# Altium footprint library SG__PCB_HOLE_Connector.PcbLib: 174 footprints (part 9 of 11)
Each footprint in its own frame and in the unit in brackets; x right, y up, seen from the top. Pads: shape width x height; smd on the part's side, far side on the other; paste and mask are expansions set on the pad; w line width, h text height; cw(c..) or ccw(c..) is an arc to the next point about the centre after c.
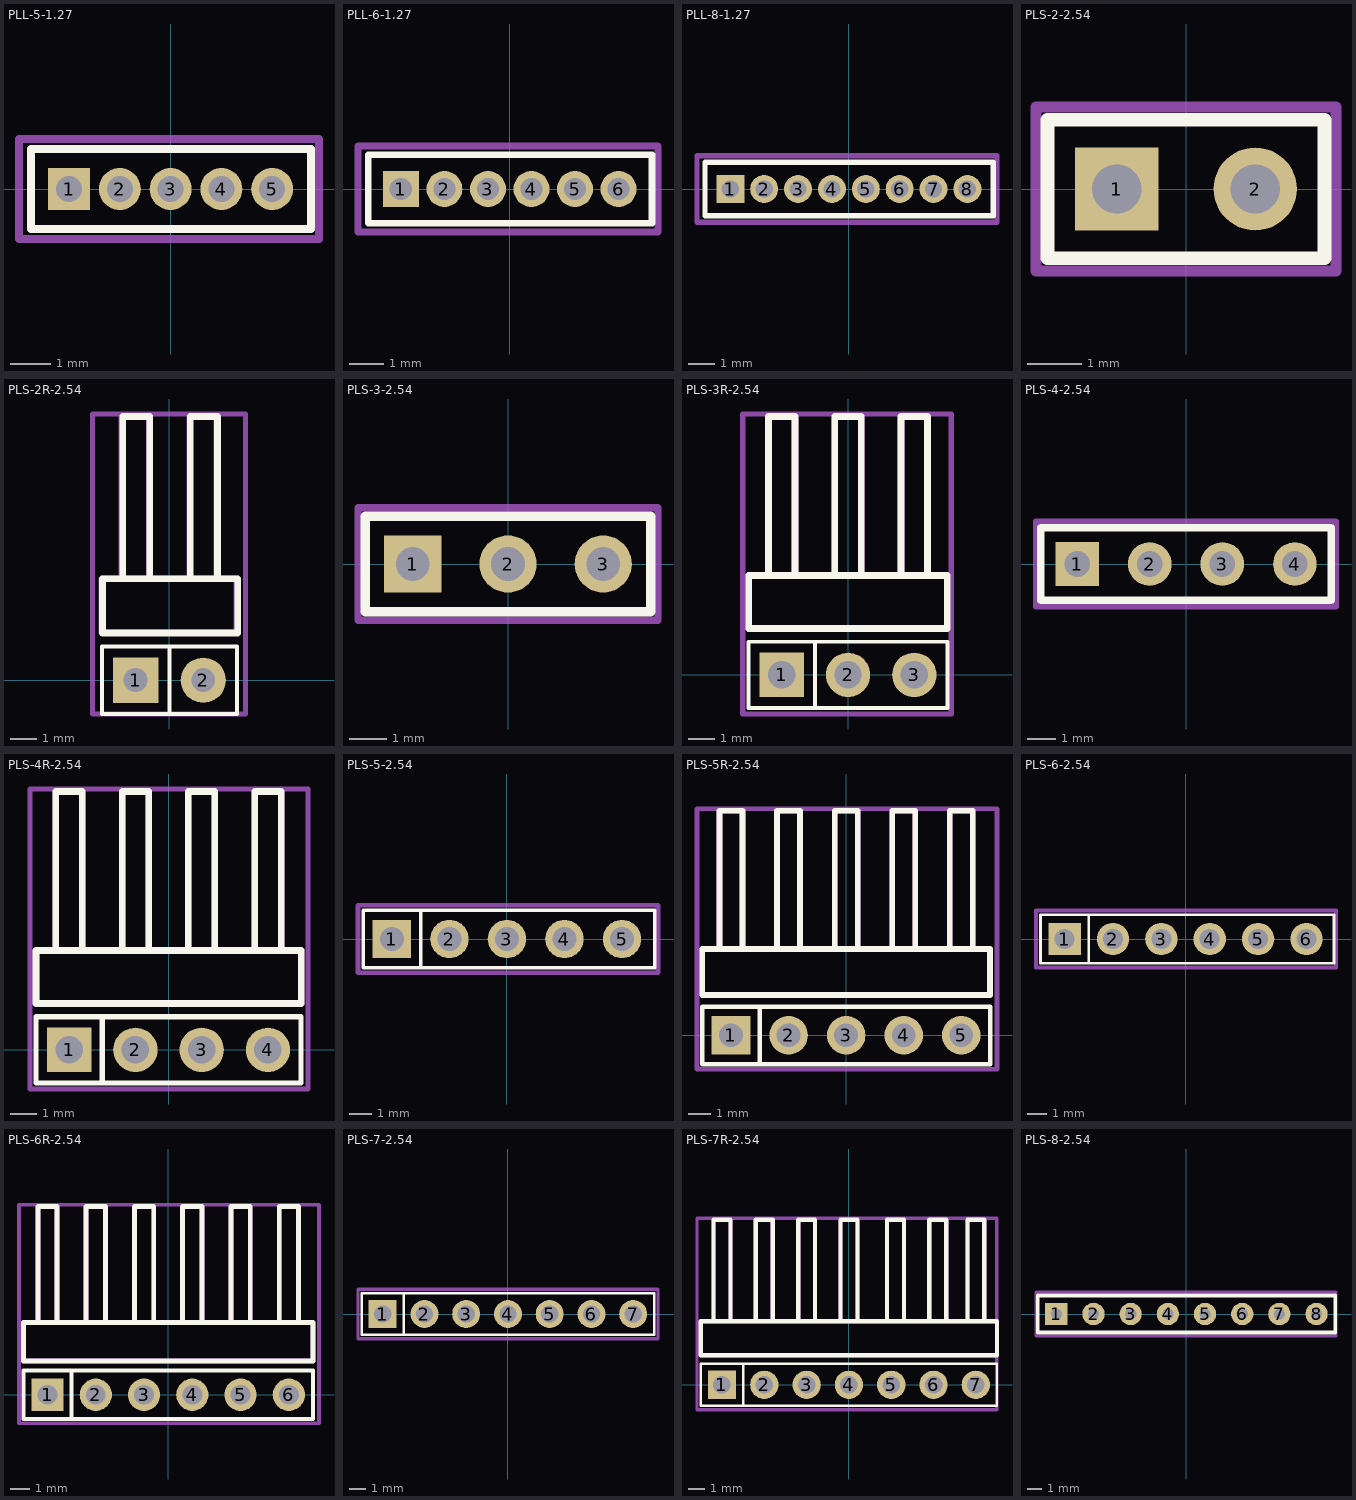
[diagram p8: the footprints below, top view; thin cyan lines are the x and y axes]

## PLL-5-1.27 [mm]
pads (5):
  rect 1.05x1.05 hole 0.65 mask+0.05: 1(-2.54,0)
  round 1.05 hole 0.65 mask+0.05: 2(-1.27,0) 3(0,0) 4(1.27,0) 5(2.54,0)
Top Overlay:
  lines w0.2: -3.49,-1 -3.49,1 3.51,1 3.51,-1 -3.49,-1
Top Courtyard:
  lines w0.2: -3.79,-1.25 -3.79,1.25 3.71,1.25 3.71,-1.25 -3.79,-1.25

## PLL-6-1.27 [mm]
pads (6):
  rect 1.05x1.05 hole 0.65 mask+0.05: 1(-3.175,0)
  round 1.05 hole 0.65 mask+0.05: 2(-1.905,0) 3(-0.635,0) 4(0.635,0) 5(1.905,0) 6(3.175,0)
Top Overlay:
  lines w0.2: -4.125,-1 4.145,-1 4.145,1 -4.125,1 -4.125,-1
Top Courtyard:
  lines w0.2: -4.425,-1.25 -4.425,1.25 4.325,1.25 4.325,-1.25 -4.425,-1.25

## PLL-8-1.27 [mm]
pads (8):
  rect 1.05x1.05 hole 0.65 mask+0.05: 1(-4.445,0)
  round 1.05 hole 0.65 mask+0.05: 2(-3.175,0) 3(-1.905,0) 4(-0.635,0) 5(0.635,0) 6(1.905,0) 7(3.175,0) 8(4.445,0)
Top Overlay:
  lines w0.2: -5.395,-1 5.415,-1 5.415,1 -5.395,1 -5.395,-1
Top Courtyard:
  lines w0.2: -5.695,-1.25 5.555,-1.25 5.555,1.25 -5.695,1.25 -5.695,-1.25

## PLS-2-2.54 [mil]
height 472.44
pads (2):
  rect 60x60 hole 35.43: 1(-50,0)
  round 60 hole 35.43: 2(50,0)
Top Overlay:
  lines w10: -100,-50 -100,50 100,50 100,-50 -100,-50
Top Courtyard:
  lines w7.87: -108.27,-59.06 -108.27,59.06 108.27,59.06 108.27,-59.06 -108.27,-59.06
3D body "PLS1.stp": height 336.22, standoff -118.11, extent -100,-50 0,50
3D body "PLS1.stp": height 336.22, standoff -118.11, extent 0,-50 100,50

## PLS-2R-2.54 [mm]
pads (2):
  rect 1.7x1.7 hole 0.9 mask+0.05: 1(-1.27,0)
  round 1.7 hole 0.9 mask+0.05: 2(1.27,0)
Top Overlay:
  lines w0.15: 0,-1.27 0,1.27 ; -2.54,-1.27 2.54,-1.27 2.54,1.27 -2.54,1.27 -2.54,-1.27
  lines w0.254: -1.755,3.807 -1.755,9.903 -0.739,9.903 -0.739,3.807 ; 0.785,3.807 0.785,9.903 1.801,9.903 1.801,3.807 ; -2.517,1.775 -2.517,3.807 2.563,3.807 2.563,1.775 -2.517,1.775
Top Assembly:
  lines w0.254: -1.778,3.81 -1.778,9.906 -0.762,9.906 -0.762,3.81 ; 0.762,3.81 0.762,9.906 1.778,9.906 1.778,3.81 ; -2.54,1.778 -2.54,3.81 2.54,3.81 2.54,1.778 -2.54,1.778
Top Courtyard:
  lines w0.2: -2.889,-1.27 -2.889,10 2.854,10 2.854,-1.27 -2.889,-1.27
3D body "PLS-1R_D1.STEP": height 3, standoff -2.5, extent -2.54,-0.354 0,10.006
3D body "PLS-1R_D1.STEP": height 3, standoff -2.5, extent 0,-0.32 2.54,10.04

## PLS-3-2.54 [mil]
pads (3):
  rect 60x60 hole 35.43: 1(-100,0)
  round 60 hole 35.43: 2(0,0) 3(100,0)
Top Overlay:
  lines w10: -150,-50 150,-50 150,50 -150,50 -150,-50
Top Courtyard:
  lines w7.87: -157.48,-59.06 157.48,-59.06 157.48,59.06 -157.48,59.06 -157.48,-59.06
3D body "PLS1.stp": height 336.22, standoff -118.11, extent 50,-50 150,50
3D body "PLS1.stp": height 336.22, standoff -118.11, extent -50,-50 50,50
3D body "PLS1.stp": height 336.22, standoff -118.11, extent -150,-50 -50,50

## PLS-3R-2.54 [mm]
pads (3):
  rect 1.7x1.7 hole 1.05 mask+0.05: 1(-2.54,0)
  round 1.7 hole 1.05 mask+0.05: 2(0,0) 3(2.54,0)
Top Overlay:
  lines w0.15: -1.27,-1.27 -1.27,1.27 ; -3.81,-1.27 3.81,-1.27 3.81,1.27 -3.81,1.27 -3.81,-1.27
  lines w0.254: -3.048,3.81 -3.048,9.906 -2.032,9.906 -2.032,3.81 ; -0.508,3.81 -0.508,9.906 0.508,9.906 0.508,3.81 ; 2.032,3.81 2.032,9.906 3.048,9.906 3.048,3.81 ; -3.81,1.778 -3.81,3.81 3.81,3.81 3.81,1.778 -3.81,1.778
Top Assembly:
  lines w0.254: -3.048,3.81 -3.048,9.906 -2.032,9.906 -2.032,3.81 ; -0.508,3.81 -0.508,9.906 0.508,9.906 0.508,3.81 ; 2.032,3.81 2.032,9.906 3.048,9.906 3.048,3.81 ; -3.81,1.778 -3.81,3.81 3.81,3.81 3.81,1.778 -3.81,1.778
Top Courtyard:
  lines w0.2: -4.04,-1.5 3.96,-1.5 3.96,10 -4.04,10 -4.04,-1.5
3D body "PLS-1R_D1.STEP": height 3, standoff -2.5, extent -3.81,-0.354 -1.27,10.006
3D body "PLS-1R_D1.STEP": height 3, standoff -2.5, extent -1.27,-0.32 1.27,10.04
3D body "PLS-1R_D1.STEP": height 3, standoff -2.5, extent 1.27,-0.32 3.81,10.04

## PLS-4-2.54 [mil]
pads (4):
  rect 60x60 hole 35.43: 1(-150,0)
  round 60 hole 35.43: 2(-50,0) 3(50,0) 4(150,0)
Top Overlay:
  lines w10: -200,-50 200,-50 200,50 -200,50 -200,-50
Top Courtyard:
  lines w7.87: -206.69,-59.06 -206.69,59.06 206.69,59.06 206.69,-59.06 -206.69,-59.06
3D body "PLS1.stp": height 336.22, standoff -118.11, extent 100,-50 200,50
3D body "PLS1.stp": height 336.22, standoff -118.11, extent 0,-50 100,50
3D body "PLS1.stp": height 336.22, standoff -118.11, extent -100,-50 0,50
3D body "PLS1.stp": height 336.22, standoff -118.11, extent -200,-50 -100,50

## PLS-4R-2.54 [mm]
pads (4):
  rect 1.7x1.7 hole 1.05 mask+0.05: 1(-3.81,0)
  round 1.7 hole 1.05 mask+0.05: 2(-1.27,0) 3(1.27,0) 4(3.81,0)
Top Overlay:
  lines w0.2: -2.54,-1.27 -2.54,1.27 ; -5.08,-1.27 -5.08,1.27 5.08,1.27 5.08,-1.27 -5.08,-1.27
  lines w0.254: -4.318,3.81 -4.318,9.906 -3.302,9.906 -3.302,3.81 ; -1.778,3.81 -1.778,9.906 -0.762,9.906 -0.762,3.81 ; 0.762,3.81 0.762,9.906 1.778,9.906 1.778,3.81 ; 3.302,3.81 3.302,9.906 4.318,9.906 4.318,3.81 ; -5.08,1.778 -5.08,3.81 5.08,3.81 5.08,1.778 -5.08,1.778
Top Assembly:
  lines w0.254: -4.318,3.81 -4.318,9.906 -3.302,9.906 -3.302,3.81 ; -1.778,3.81 -1.778,9.906 -0.762,9.906 -0.762,3.81 ; 0.762,3.81 0.762,9.906 1.778,9.906 1.778,3.81 ; 3.302,3.81 3.302,9.906 4.318,9.906 4.318,3.81 ; -5.08,1.778 -5.08,3.81 5.08,3.81 5.08,1.778 -5.08,1.778
Top Courtyard:
  lines w0.2: -5.31,-1.5 -5.31,10 5.344,10 5.344,-1.5 -5.31,-1.5
3D body "PLS-1R_D1.STEP": height 3, standoff -2.5, extent 2.54,-0.32 5.08,10.04
3D body "PLS-1R_D1.STEP": height 3, standoff -2.5, extent 0,-0.32 2.54,10.04
3D body "PLS-1R_D1.STEP": height 3, standoff -2.5, extent -2.54,-0.32 0,10.04
3D body "PLS-1R_D1.STEP": height 3, standoff -2.5, extent -5.08,-0.354 -2.54,10.006

## PLS-5-2.54 [mm]
pads (5):
  rect 1.7x1.7 hole 1.05 mask+0.05: 1(-5.08,0)
  round 1.7 hole 1.05 mask+0.05: 2(-2.54,0) 3(0,0) 4(2.54,0) 5(5.08,0)
Top Overlay:
  lines w0.15: -3.81,-1.27 -3.81,1.27 ; -6.35,-1.27 -6.35,1.27 6.52,1.27 6.52,-1.27 -6.35,-1.27
Top Courtyard:
  lines w0.2: -6.58,-1.5 6.67,-1.5 6.67,1.5 -6.58,1.5 -6.58,-1.5
3D body "PLS1.stp": height 8.54, standoff -3, extent 3.81,-1.27 6.35,1.27
3D body "PLS1.stp": height 8.54, standoff -3, extent 1.27,-1.27 3.81,1.27
3D body "PLS1.stp": height 8.54, standoff -3, extent -1.27,-1.27 1.27,1.27
3D body "PLS1.stp": height 8.54, standoff -3, extent -3.81,-1.27 -1.27,1.27
3D body "PLS1.stp": height 8.54, standoff -3, extent -6.35,-1.27 -3.81,1.27

## PLS-5R-2.54 [mm]
pads (5):
  rect 1.7x1.7 hole 1.05 mask+0.05: 1(-5.08,0)
  round 1.7 hole 1.05 mask+0.05: 2(-2.54,0) 3(0,0) 4(2.54,0) 5(5.08,0)
Top Overlay:
  lines w0.2: -3.81,-1.27 -3.81,1.27 ; -6.35,-1.27 -6.35,1.27 6.35,1.27 6.35,-1.27 -6.35,-1.27
  lines w0.254: -5.588,3.81 -5.588,9.906 -4.572,9.906 -4.572,3.81 ; -3.048,3.81 -3.048,9.906 -2.032,9.906 -2.032,3.81 ; -0.508,3.81 -0.508,9.906 0.508,9.906 0.508,3.81 ; 2.032,3.81 2.032,9.906 3.048,9.906 3.048,3.81 ; 4.572,3.81 4.572,9.906 5.588,9.906 5.588,3.81 ; -6.35,1.778 -6.35,3.81 6.35,3.81 6.35,1.778 -6.35,1.778
Top Assembly:
  lines w0.254: -5.588,3.81 -5.588,9.906 -4.572,9.906 -4.572,3.81 ; -3.048,3.81 -3.048,9.906 -2.032,9.906 -2.032,3.81 ; -0.508,3.81 -0.508,9.906 0.508,9.906 0.508,3.81 ; 2.032,3.81 2.032,9.906 3.048,9.906 3.048,3.81 ; 4.572,3.81 4.572,9.906 5.588,9.906 5.588,3.81 ; -6.35,1.778 -6.35,3.81 6.35,3.81 6.35,1.778 -6.35,1.778
Top Courtyard:
  lines w0.2: -6.58,-1.5 6.656,-1.5 6.656,10 -6.58,10 -6.58,-1.5
3D body "PLS-1R_D1.STEP": height 3, standoff -2.5, extent -6.35,-0.354 -3.81,10.006
3D body "PLS-1R_D1.STEP": height 3, standoff -2.5, extent -3.81,-0.32 -1.27,10.04
3D body "PLS-1R_D1.STEP": height 3, standoff -2.5, extent -1.27,-0.32 1.27,10.04
3D body "PLS-1R_D1.STEP": height 3, standoff -2.5, extent 1.27,-0.32 3.81,10.04
3D body "PLS-1R_D1.STEP": height 3, standoff -2.5, extent 3.81,-0.32 6.35,10.04

## PLS-6-2.54 [mm]
pads (6):
  rect 1.7x1.7 hole 1.05 mask+0.05: 1(-6.35,0)
  round 1.7 hole 1.05 mask+0.05: 2(-3.81,0) 3(-1.27,0) 4(1.27,0) 5(3.81,0) 6(6.35,0)
Top Overlay:
  lines w0.15: -5.08,-1.27 -5.08,1.27 ; -7.62,-1.27 7.79,-1.27 7.79,1.27 -7.62,1.27 -7.62,-1.27
Top Courtyard:
  lines w0.2: -7.85,-1.5 -7.85,1.5 7.9,1.5 7.9,-1.5 -7.85,-1.5
3D body "PLS1.stp": height 8.54, standoff -3, extent -2.54,-1.27 0,1.27
3D body "PLS1.stp": height 8.54, standoff -3, extent 0,-1.27 2.54,1.27
3D body "PLS1.stp": height 8.54, standoff -3, extent 2.54,-1.27 5.08,1.27
3D body "PLS1.stp": height 8.54, standoff -3, extent 5.08,-1.27 7.62,1.27
3D body "PLS1.stp": height 8.54, standoff -3, extent -7.62,-1.27 -5.08,1.27
3D body "PLS1.stp": height 8.54, standoff -3, extent -5.08,-1.27 -2.54,1.27

## PLS-6R-2.54 [mm]
pads (6):
  rect 1.7x1.7 hole 1.05 mask+0.05: 1(-6.35,0)
  round 1.7 hole 1.05 mask+0.05: 2(-3.81,0) 3(-1.27,0) 4(1.27,0) 5(3.81,0) 6(6.35,0)
Top Overlay:
  lines w0.2: -5.08,-1.27 -5.08,1.27 ; -7.62,-1.27 7.62,-1.27 7.62,1.27 -7.62,1.27 -7.62,-1.27
  lines w0.254: -6.858,3.81 -6.858,9.906 -5.842,9.906 -5.842,3.81 ; -4.318,3.81 -4.318,9.906 -3.302,9.906 -3.302,3.81 ; -1.778,3.81 -1.778,9.906 -0.762,9.906 -0.762,3.81 ; 0.762,3.81 0.762,9.906 1.778,9.906 1.778,3.81 ; 3.302,3.81 3.302,9.906 4.318,9.906 4.318,3.81 ; 5.842,3.81 5.842,9.906 6.858,9.906 6.858,3.81 ; -7.62,1.778 7.62,1.778 7.62,3.81 -7.62,3.81 -7.62,1.778
Top Assembly:
  lines w0.254: -6.858,3.81 -6.858,9.906 -5.842,9.906 -5.842,3.81 ; -4.318,3.81 -4.318,9.906 -3.302,9.906 -3.302,3.81 ; -1.778,3.81 -1.778,9.906 -0.762,9.906 -0.762,3.81 ; 0.762,3.81 0.762,9.906 1.778,9.906 1.778,3.81 ; 3.302,3.81 3.302,9.906 4.318,9.906 4.318,3.81 ; 5.842,3.81 5.842,9.906 6.858,9.906 6.858,3.81 ; -7.62,1.778 -7.62,3.81 7.62,3.81 7.62,1.778 -7.62,1.778
Top Courtyard:
  lines w0.2: -7.85,-1.5 -7.85,10 7.938,10 7.938,-1.5 -7.85,-1.5
3D body "PLS-1R_D1.STEP": height 3, standoff -2.5, extent 5.08,-0.32 7.62,10.04
3D body "PLS-1R_D1.STEP": height 3, standoff -2.5, extent 2.54,-0.32 5.08,10.04
3D body "PLS-1R_D1.STEP": height 3, standoff -2.5, extent 0,-0.32 2.54,10.04
3D body "PLS-1R_D1.STEP": height 3, standoff -2.5, extent -2.54,-0.32 0,10.04
3D body "PLS-1R_D1.STEP": height 3, standoff -2.5, extent -5.08,-0.32 -2.54,10.04
3D body "PLS-1R_D1.STEP": height 3, standoff -2.5, extent -7.62,-0.354 -5.08,10.006

## PLS-7-2.54 [mm]
pads (7):
  rect 1.7x1.7 hole 1.05 mask+0.05: 1(-7.62,0)
  round 1.7 hole 1.05 mask+0.05: 2(-5.08,0) 3(-2.54,0) 4(0,0) 5(2.54,0) 6(5.08,0) 7(7.62,0)
Top Overlay:
  lines w0.15: -6.35,-1.27 -6.35,1.27 ; -8.89,-1.27 -8.89,1.27 8.89,1.27 8.89,-1.27 -8.89,-1.27
Top Courtyard:
  lines w0.2: -9.12,-1.5 9.13,-1.5 9.13,1.5 -9.12,1.5 -9.12,-1.5
3D body "PLS1.stp": height 8.54, standoff -3, extent -8.89,-1.27 -6.35,1.27
3D body "PLS1.stp": height 8.54, standoff -3, extent -6.35,-1.27 -3.81,1.27
3D body "PLS1.stp": height 8.54, standoff -3, extent -3.81,-1.27 -1.27,1.27
3D body "PLS1.stp": height 8.54, standoff -3, extent -1.27,-1.27 1.27,1.27
3D body "PLS1.stp": height 8.54, standoff -3, extent 1.27,-1.27 3.81,1.27
3D body "PLS1.stp": height 8.54, standoff -3, extent 3.81,-1.27 6.35,1.27
3D body "PLS1.stp": height 8.54, standoff -3, extent 6.35,-1.27 8.89,1.27

## PLS-7R-2.54 [mm]
pads (7):
  rect 1.7x1.7 hole 1.05 mask+0.05: 1(-7.62,0)
  round 1.7 hole 1.05 mask+0.05: 2(-5.08,0) 3(-2.54,0) 4(0,0) 5(2.54,0) 6(5.08,0) 7(7.62,0)
Top Overlay:
  lines w0.15: -6.35,-1.27 -6.35,1.27 ; -8.89,-1.27 -8.89,1.27 8.89,1.27 8.89,-1.27 -8.89,-1.27
  lines w0.254: -8.128,3.81 -8.128,9.906 -7.112,9.906 -7.112,3.81 ; -5.588,3.81 -5.588,9.906 -4.572,9.906 -4.572,3.81 ; -3.048,3.81 -3.048,9.906 -2.032,9.906 -2.032,3.81 ; -0.508,3.81 -0.508,9.906 0.508,9.906 0.508,3.81 ; 2.286,3.81 2.286,9.906 3.302,9.906 3.302,3.81 ; 4.826,3.81 4.826,9.906 5.842,9.906 5.842,3.81 ; 7.112,3.81 7.112,9.906 8.128,9.906 8.128,3.81 ; -8.89,1.778 8.89,1.778 8.89,3.81 -8.89,3.81 -8.89,1.778
Top Assembly:
  lines w0.254: -8.128,3.81 -8.128,9.906 -7.112,9.906 -7.112,3.81 ; -5.588,3.81 -5.588,9.906 -4.572,9.906 -4.572,3.81 ; -3.048,3.81 -3.048,9.906 -2.032,9.906 -2.032,3.81 ; -0.508,3.81 -0.508,9.906 0.508,9.906 0.508,3.81 ; 2.286,3.81 2.286,9.906 3.302,9.906 3.302,3.81 ; 4.826,3.81 4.826,9.906 5.842,9.906 5.842,3.81 ; 7.112,3.81 7.112,9.906 8.128,9.906 8.128,3.81 ; -8.89,1.778 8.89,1.778 8.89,3.81 -8.89,3.81 -8.89,1.778
Top Courtyard:
  lines w0.2: -9.12,-1.5 8.88,-1.5 8.88,10 -9.12,10 -9.12,-1.5
3D body "PLS-1R_D1.STEP": height 3, standoff -2.5, extent 6.35,-0.32 8.89,10.04
3D body "PLS-1R_D1.STEP": height 3, standoff -2.5, extent 3.81,-0.32 6.35,10.04
3D body "PLS-1R_D1.STEP": height 3, standoff -2.5, extent 1.27,-0.32 3.81,10.04
3D body "PLS-1R_D1.STEP": height 3, standoff -2.5, extent -1.27,-0.32 1.27,10.04
3D body "PLS-1R_D1.STEP": height 3, standoff -2.5, extent -3.81,-0.32 -1.27,10.04
3D body "PLS-1R_D1.STEP": height 3, standoff -2.5, extent -6.35,-0.32 -3.81,10.04
3D body "PLS-1R_D1.STEP": height 3, standoff -2.5, extent -8.89,-0.354 -6.35,10.006

## PLS-8-2.54 [mil]
pads (8):
  rect 60x60 hole 30: 1(-350,0)
  round 60 hole 30: 2(-250,0) 3(-150,0) 4(-50,0) 5(50,0) 6(150,0) 7(250,0) 8(350,0)
Top Overlay:
  lines w10: -4.33,-50 395.67,-50 ; -4.33,50 395.67,50 ; 0,-50 -400,-50 -400,50 0,50 ; 400,-50 400,50
Top Courtyard:
  lines w7.87: -404.72,-59.06 -404.72,59.06 402.36,59.06 402.36,-59.06 -404.72,-59.06
3D body "PLS1.stp": height 336.22, standoff -118.11, extent -400,-50 -300,50
3D body "PLS1.stp": height 336.22, standoff -118.11, extent -300,-50 -200,50
3D body "PLS1.stp": height 336.22, standoff -118.11, extent -200,-50 -100,50
3D body "PLS1.stp": height 336.22, standoff -118.11, extent -100,-50 0,50
3D body "PLS1.stp": height 336.22, standoff -118.11, extent 0,-50 100,50
3D body "PLS1.stp": height 336.22, standoff -118.11, extent 100,-50 200,50
3D body "PLS1.stp": height 336.22, standoff -118.11, extent 200,-50 300,50
3D body "PLS1.stp": height 336.22, standoff -118.11, extent 300,-50 400,50